# Altium footprint library MainFPs.PcbLib: 206 footprints (part 12 of 13)
Each footprint in its own frame and in the unit in brackets; x right, y up, seen from the top. Pads: shape width x height; smd on the part's side, far side on the other; paste and mask are expansions set on the pad; w line width, h text height; cw(c..) or ccw(c..) is an arc to the next point about the centre after c.
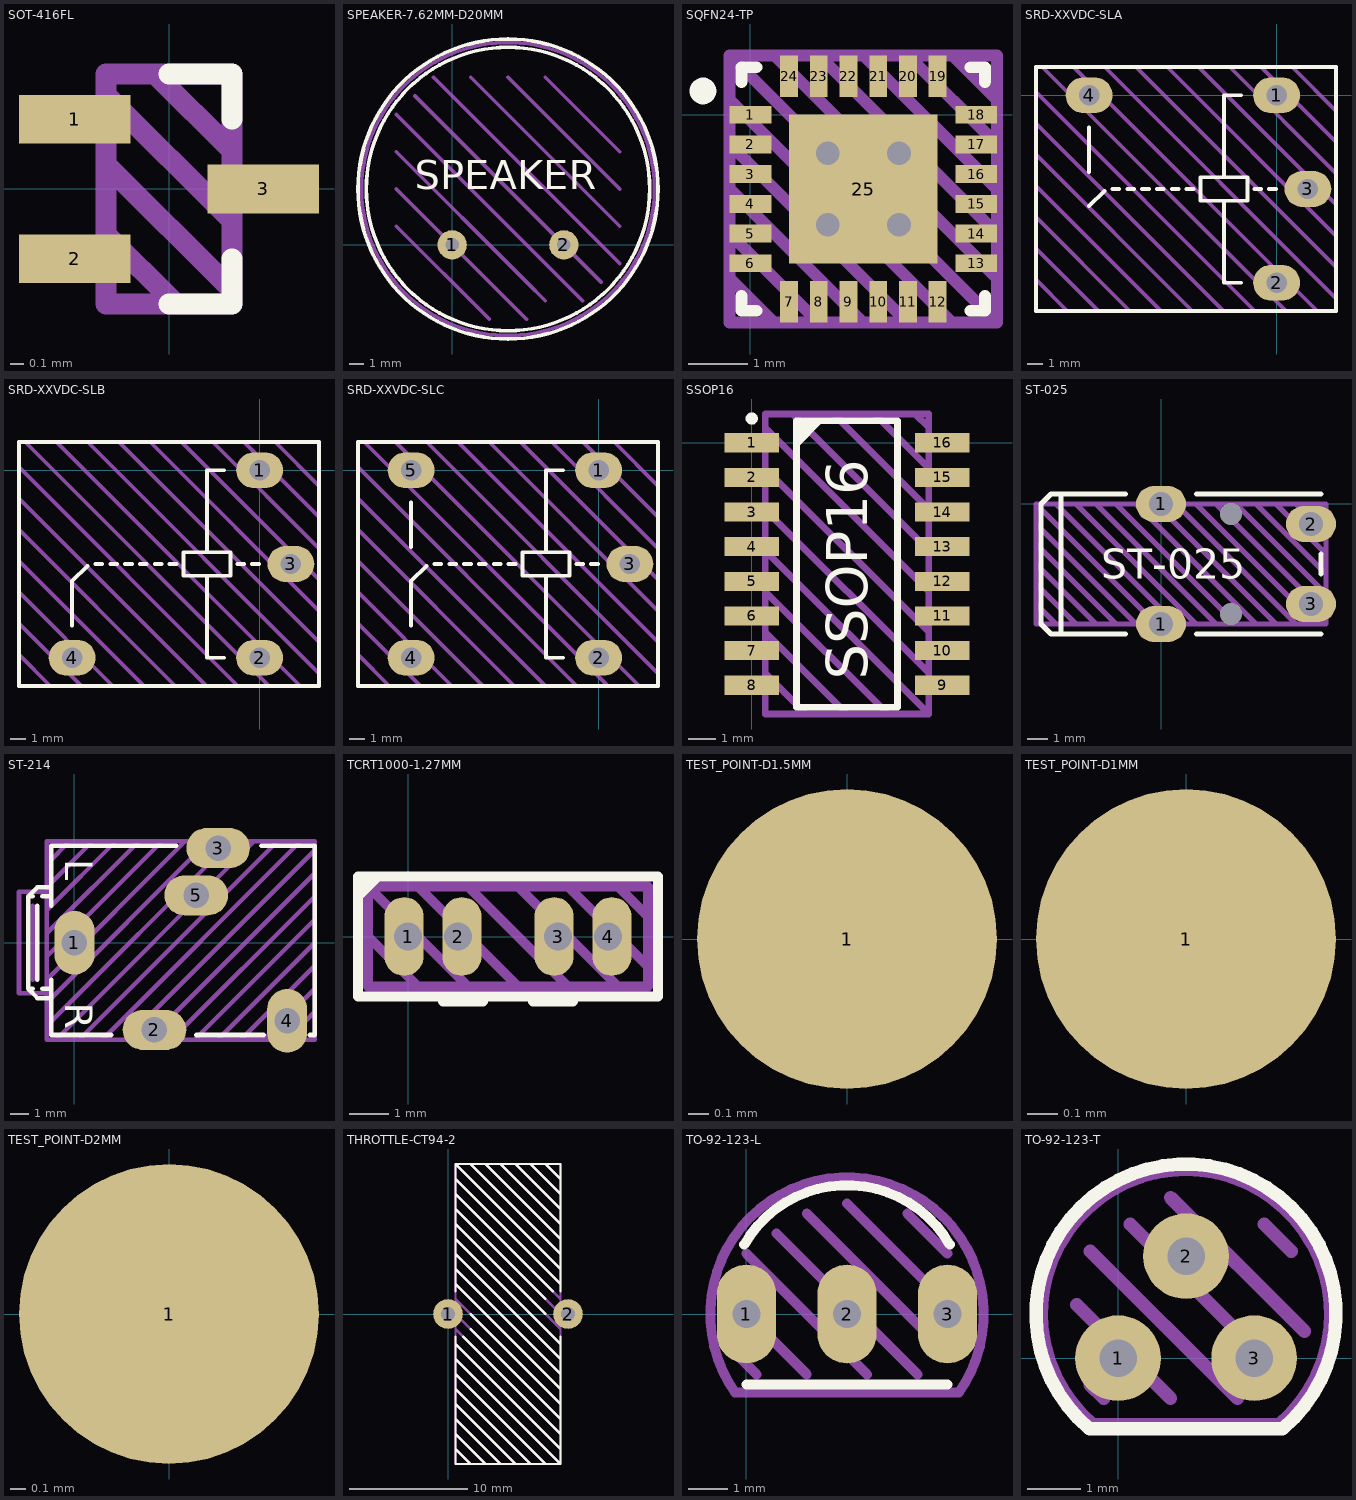
[diagram p11: the footprints below, top view; thin cyan lines are the x and y axes]

## SOT-416FL [mm] "SC-89 (EMT3)"
pads (3):
  rect 0.8x0.35 smd: 1(-0.675,0.5) 2(-0.675,-0.5) 3(0.675,0)
Top Overlay:
  lines w0.15: 0,-0.825 0.45,-0.825 0.45,-0.5 ; 0,0.825 0.45,0.825 0.45,0.5
Draw:
  lines w0.15: -0.45,-0.325 0.05,-0.825 ; -0.45,0.175 0.45,-0.725 ; -0.45,0.675 0.45,-0.225 ; -0.1,0.825 0.45,0.275 ; -0.45,-0.825 -0.45,0.825 0.45,0.825 0.45,-0.825 -0.45,-0.825
3D body "SOTFL50P160X73-3N.step": height 0.73, standoff 0, extent -0.8,-0.823 0.8,0.823

## SPEAKER-7.62MM-D20MM [mm]
pads (2):
  round 2 hole 0.9: 1(0,0) 2(7.62,0)
Top Overlay:
  circle w0.25: c3.81,3.81 r10.239
  circle w0.25: c3.81,3.81 r9.672
  text "SPEAKER" at -2.54,3.81 h2
Draw:
  circle w0.25: c3.81,3.81 r10
  lines w0.25: -3.81,1.27 2.54,-5.08 ; -3.81,3.81 5.08,-5.08 ; -3.81,6.35 5.08,-2.54 6.35,-3.81 ; -3.81,8.89 8.89,-3.81 ; -2.54,10.16 10.16,-2.54 ; -1.27,11.43 11.43,-1.27 ; 1.27,11.43 11.43,1.27 ; 3.81,11.43 11.43,3.81 ; 6.35,11.43 11.43,6.35
Info:
  text "'.Comment'" at -5.08,-8.89 h1.5

## SQFN24-TP [mm]
height 1
pads (25):
  rect 0.7x0.3 smd: 1(0,0) 2(0,-0.5) 3(0,-1) 4(0,-1.5) 5(0,-2) 6(0,-2.5) 13(3.8,-2.5) 14(3.8,-2) 15(3.8,-1.5) 16(3.8,-1) 17(3.8,-0.5) 18(3.8,0)
  rect 0.3x0.7 smd: 7(0.65,-3.15) 8(1.15,-3.15) 9(1.65,-3.15) 10(2.15,-3.15) 11(2.65,-3.15) 12(3.15,-3.15) 19(3.15,0.65) 20(2.65,0.65) 21(2.15,0.65) 22(1.65,0.65) 23(1.15,0.65) 24(0.65,0.65)
  rect 2.5x2.5 all layers, no hole: 25(1.9,-1.25)
via 2.5,-0.65 diameter 0.8 hole 0.4
via 2.5,-1.85 diameter 0.8 hole 0.4
via 1.3,-1.85 diameter 0.8 hole 0.4
via 1.3,-0.65 diameter 0.8 hole 0.4
Top Overlay:
  circle w0.25: c-0.8,0.4 r0.1
  lines w0.2: -0.15,-3.05 -0.15,-3.3 0.1,-3.3 ; -0.15,0.55 -0.15,0.8 0.1,0.8 ; 3.7,-3.3 3.95,-3.3 3.95,-3.05 ; 3.7,0.8 3.95,0.8 3.95,0.55
Draw:
  lines w0.2: -0.35,-2.75 0.4,-3.5 ; -0.35,-2 1.15,-3.5 ; -0.35,-1.25 1.9,-3.5 ; -0.35,-0.5 2.65,-3.5 ; -0.35,0.25 3.4,-3.5 ; 0.4,1 4.15,-2.75 ; 1.15,1 4.15,-2 ; 1.9,1 4.15,-1.25 ; 2.65,1 4.15,-0.5 ; 3.4,1 4.15,0.25 ; -0.35,1 4.15,1 4.15,-3.5 ; -0.35,1 -0.35,-3.5 4.15,-3.5 ; -0.35,1 4.15,-3.5
Info:
  text "'.Comment'" at -1.286,-4.687 h0.75
3D body "PQFN127P600-8N.step": height 1, standoff 0, extent -0.15,-3.3 3.95,0.8

## SRD-XXVDC-SLA [mm]
pads (4):
  oval 3x2.3 hole 1.3: 1(0,0) 2(0,-12) 3(2,-6) 4(-12,0)
Top Overlay:
  lines w0.25: -12,-7.1 -11.025,-6.125 ; -12,-4.9 -12,-2.05 ; -10.512,-6 -10.075,-6 ; -9.562,-6 -9.125,-6 ; -8.612,-6 -8.175,-6 ; -7.663,-6 -7.225,-6 ; -6.713,-6 -6.275,-6 ; -5.763,-6 -5.325,-6 ; -3.375,-6.75 -3.375,-12 -2.275,-12 ; -3.375,-5.25 -3.375,0 -2.275,0 ; -1.425,-6 -0.987,-6 ; -0.475,-6 -0.038,-6 ; -15.4,-13.8 3.8,-13.8 3.8,1.8 -15.4,1.8 -15.4,-13.8 ; -4.875,-6.75 -4.875,-5.25 -1.875,-5.25 -1.875,-6.75 -4.875,-6.75
Draw:
  lines w0.25: -15.4,-11.8 -13.4,-13.8 ; -15.4,-9.8 -11.4,-13.8 ; -15.4,-7.8 -9.4,-13.8 ; -15.4,-5.8 -7.4,-13.8 ; -15.4,-3.8 -5.4,-13.8 ; -15.4,-1.8 -3.4,-13.8 ; -15.4,0.2 -1.4,-13.8 ; -15,1.8 0.6,-13.8 ; -13,1.8 2.6,-13.8 ; -11,1.8 3.8,-13 ; -9,1.8 3.8,-11 ; -7,1.8 3.8,-9 ; -5,1.8 3.8,-7 ; -3,1.8 3.8,-5 ; -1,1.8 3.8,-3 ; 1,1.8 3.8,-1 ; -15.4,-13.8 -15.4,1.8 3.8,1.8 3.8,-13.8 -15.4,-13.8
Info:
  text "'.Comment'" at -15.4,-16.7 h2
3D body: height 15.8, standoff 0, extent -15.4,-13.8 3.8,1.8
3D body: height 1, standoff -3, extent 1.8,-6.55 2.2,-5.45
3D body: height 1, standoff -3, extent -0.3,-0.25 0.3,0.25
3D body: height 1, standoff -3, extent -0.3,-12.25 0.3,-11.75
3D body: height 1, standoff -3, extent -12.5,-0.25 -11.5,0.25

## SRD-XXVDC-SLB [mm]
pads (4):
  oval 3x2.3 hole 1.3: 1(0,0) 2(0,-12) 3(2,-6) 4(-12,-12)
Top Overlay:
  lines w0.25: -12,-9.95 -12,-7.1 -11.025,-6.125 ; -10.512,-6 -10.075,-6 ; -9.562,-6 -9.125,-6 ; -8.612,-6 -8.175,-6 ; -7.663,-6 -7.225,-6 ; -6.713,-6 -6.275,-6 ; -5.763,-6 -5.325,-6 ; -3.375,-6.75 -3.375,-12 -2.275,-12 ; -3.375,-5.25 -3.375,0 -2.275,0 ; -1.425,-6 -0.987,-6 ; -0.475,-6 -0.038,-6 ; -15.4,-13.8 3.8,-13.8 3.8,1.8 -15.4,1.8 -15.4,-13.8 ; -4.875,-6.75 -4.875,-5.25 -1.875,-5.25 -1.875,-6.75 -4.875,-6.75
Draw:
  lines w0.25: -15.4,-11.8 -13.4,-13.8 ; -15.4,-9.8 -11.4,-13.8 ; -15.4,-7.8 -9.4,-13.8 ; -15.4,-5.8 -7.4,-13.8 ; -15.4,-3.8 -5.4,-13.8 ; -15.4,-1.8 -3.4,-13.8 ; -15.4,0.2 -1.4,-13.8 ; -15,1.8 0.6,-13.8 ; -13,1.8 2.6,-13.8 ; -11,1.8 3.8,-13 ; -9,1.8 3.8,-11 ; -7,1.8 3.8,-9 ; -5,1.8 3.8,-7 ; -3,1.8 3.8,-5 ; -1,1.8 3.8,-3 ; 1,1.8 3.8,-1 ; -15.4,-13.8 -15.4,1.8 3.8,1.8 3.8,-13.8 -15.4,-13.8
Info:
  text "'.Comment'" at -15.4,-16.7 h2
3D body: height 15.8, standoff 0, extent -15.4,-13.8 3.8,1.8
3D body: height 1, standoff -3, extent 1.8,-6.55 2.2,-5.45
3D body: height 1, standoff -3, extent -0.3,-0.25 0.3,0.25
3D body: height 1, standoff -3, extent -0.3,-12.25 0.3,-11.75
3D body: height 1, standoff -3, extent -12.5,-12.25 -11.5,-11.75

## SRD-XXVDC-SLC [mm]
pads (5):
  oval 3x2.3 hole 1.3: 1(0,0) 2(0,-12) 3(2,-6) 4(-12,-12) 5(-12,0)
Top Overlay:
  lines w0.25: -12,-9.95 -12,-7.1 -11.025,-6.125 ; -12,-4.9 -12,-2.05 ; -10.512,-6 -10.075,-6 ; -9.562,-6 -9.125,-6 ; -8.612,-6 -8.175,-6 ; -7.663,-6 -7.225,-6 ; -6.713,-6 -6.275,-6 ; -5.763,-6 -5.325,-6 ; -3.375,-6.75 -3.375,-12 -2.275,-12 ; -3.375,-5.25 -3.375,0 -2.275,0 ; -1.425,-6 -0.987,-6 ; -0.475,-6 -0.038,-6 ; -15.4,-13.8 3.8,-13.8 3.8,1.8 -15.4,1.8 -15.4,-13.8 ; -4.875,-6.75 -4.875,-5.25 -1.875,-5.25 -1.875,-6.75 -4.875,-6.75
Draw:
  lines w0.25: -15.4,-11.8 -13.4,-13.8 ; -15.4,-9.8 -11.4,-13.8 ; -15.4,-7.8 -9.4,-13.8 ; -15.4,-5.8 -7.4,-13.8 ; -15.4,-3.8 -5.4,-13.8 ; -15.4,-1.8 -3.4,-13.8 ; -15.4,0.2 -1.4,-13.8 ; -15,1.8 0.6,-13.8 ; -13,1.8 2.6,-13.8 ; -11,1.8 3.8,-13 ; -9,1.8 3.8,-11 ; -7,1.8 3.8,-9 ; -5,1.8 3.8,-7 ; -3,1.8 3.8,-5 ; -1,1.8 3.8,-3 ; 1,1.8 3.8,-1 ; -15.4,-13.8 -15.4,1.8 3.8,1.8 3.8,-13.8 -15.4,-13.8
Info:
  text "'.Comment'" at -15.4,-16.7 h2
3D body: height 15.8, standoff 0, extent -15.4,-13.8 3.8,1.8
3D body: height 1, standoff -3, extent 1.8,-6.55 2.2,-5.45
3D body: height 1, standoff -3, extent -0.3,-0.25 0.3,0.25
3D body: height 1, standoff -3, extent -0.3,-12.25 0.3,-11.75
3D body: height 1, standoff -3, extent -12.5,-0.25 -11.5,0.25
3D body: height 1, standoff -3, extent -12.5,-12.25 -11.5,-11.75

## SSOP16 [mm]
height 2
pads (16):
  rect 2x0.7 smd: 1(0,0) 2(0,-1.27) 3(0,-2.54) 4(0,-3.81) 5(0,-5.08) 6(0,-6.35) 7(0,-7.62) 8(0,-8.89) 9(7,-8.89) 10(7,-7.62) 11(7,-6.35) 12(7,-5.08) 13(7,-3.81) 14(7,-2.54) 15(7,-1.27) 16(7,0)
Top Overlay:
  circle w0.25: c0.008,0.889 r0.1
  region: 1.65,0.805 1.65,-0.199 2.654,0.805
  lines w0.25: 1.65,-9.695 1.65,0.805 5.35,0.805 5.35,-9.695 1.65,-9.695
  text "SSOP16" at 4.25,-8.695 h1.5
Draw:
  lines w0.25: 0.5,-8.445 2,-9.945 2.5,-9.945 ; 0.5,-6.945 3.5,-9.945 4.5,-9.945 ; 0.5,-5.445 5,-9.945 6.5,-9.945 ; 0.5,-3.945 6.5,-9.945 ; 0.5,-2.445 6.5,-8.445 6.5,-9.945 ; 0.5,-0.945 6.5,-6.945 ; 0.5,0.555 6.5,-5.445 ; 1.5,1.055 6.5,-3.945 ; 2,1.055 3,1.055 6.5,-2.445 ; 4.5,1.055 6.5,-0.945 ; 6,1.055 6.5,0.555 ; 6.5,-9.945 0.5,-9.945 0.5,1.055 6.5,1.055 6.5,-9.945 ; 6.5,-6.945 6.5,-6.945
Info:
  text "'.Comment'" at -0.564,-11.303 h1
3D body "SSOP16.step": height 2, standoff 0, extent -0.05,-9.695 7.05,0.805

## ST-025 [mm]
pads (6):
  oval 2.5x1.8 hole 1.2: 1(0,-6) 1(0,0) 2(7.5,-1) 3(7.5,-5)
  round 0 hole 1.1: 4(3.5,-0.5) 5(3.5,-5.5)
Top Overlay:
  lines w0.25: -5,-6.5 -5,0.5 ; -1.778,-6.5 -2,-6.5 -5.5,-6.5 ; -1.778,0.5 -5.5,0.5 -6,0 ; 1.778,-6.5 8,-6.5 ; 1.778,0.508 8,0.5 ; 8,-3.5 8,-2.5 ; -6,0 -6,-6 -5.5,-6.5 ; -6,0 -6,0 ; -5.5,-6.5 -5.5,-6.5
  text "ST-025" at -3,-3.75 h1.5
Draw:
  lines w0.25: -6.25,-5 -5.25,-6 -5,-6 ; -6.25,-4 -4.25,-6 -4,-6 ; -6.25,-3 -3.25,-6 -3,-6 ; -6.25,-2 -2.25,-6 ; -6.25,-1 -1.25,-6 -1,-6 ; -5.25,0 0.75,-6 1,-6 ; -4.25,0 1.75,-6 ; -3.25,0 2.75,-6 ; -2.25,0 3.75,-6 ; -1.25,0 4.75,-6 5,-6 ; -0.25,0 5.75,-6 7,-6 ; 0,-6 -0.25,-6 -6.25,0 ; 0.75,0 6.75,-6 ; 1.75,0 7.75,-6 ; 2.75,0 8.25,-5.5 ; 3.75,0 8.25,-4.5 ; 4.75,0 8.25,-3.5 8.25,-4.5 ; 5.75,0 8.25,-2.5 8.25,-3 ; 6.75,0 8.25,-1.5 8.25,-2 ; 7.75,0 8.25,-0.5 ; 8.25,-5 8.25,-4.5 ; -6.25,0 8.25,0 8.25,-6 -6.25,-6 -6.25,0
Info:
  text "'.Comment'" at -5.588,-8.128 h1
3D body: height 5.1, standoff 0, extent -2,0 0.5,0.25
3D body: height 0.25, standoff -2, extent 7,-1.25 8,-0.75
3D body: height 0.25, standoff -2, extent 7,-5.25 8,-4.75
3D body: height 0.25, standoff -2, extent -0.5,-6.25 0.5,-5.75
3D body: height 0.25, standoff -2, extent -0.5,-0.25 0.5,0.25
3D body: height 5, standoff 0, extent -4,-6 8.25,0
3D body: height 5, standoff 0.2, extent -6.5,-5.4 -3.5,-0.6
3D body: height 5.1, standoff 0, extent -2,-6.25 0.5,-6
3D body: height 5.1, standoff 5, extent -2,-6.25 3.5,0.25

## ST-214 [mm]
pads (5):
  oval 2.2x3.5 hole 1.4: 1(0,0) 4(11.7,-4.3)
  oval 3.5x2.2 hole 1.4: 2(4.4,-4.8) 3(7.9,5.2) 5(6.7,2.6)
Top Overlay:
  lines w0.25: -2.286,-2.54 -2.54,-2.54 ; -2.286,2.54 -2.54,2.54 ; -2.032,-2.032 -2.032,2.032 ; -1.778,-2.54 -1.27,-2.54 ; -1.778,2.54 -1.27,2.54 ; -1.27,-3.048 -2.032,-3.048 -2.54,-2.54 ; -1.27,-2.032 -1.27,-2.286 -1.27,-5.08 0.762,-5.08 2.032,-5.08 ; -1.27,2.032 -1.27,2.54 ; -1.27,3.048 -2.032,3.048 -2.54,2.54 ; 5.588,5.334 4.318,5.334 -1.27,5.334 -1.27,2.54 ; 6.7,-5.08 10.414,-5.08 ; 10.287,5.334 13.208,5.334 13.208,-5.08 12.954,-5.08 ; -2.54,-2.54 -2.54,2.54
  text "L" at -0.508,4.572 h1.52
  text "R" at -0.508,-3.302 h1.52
Draw:
  lines w0.25: -2.286,-2.032 -2.286,2.032 ; -1.524,-4.572 8.636,5.588 7.366,5.588 -1.524,-3.302 -1.524,-2.032 6.096,5.588 4.826,5.588 -1.524,-0.762 -1.524,0.508 3.556,5.588 2.286,5.588 -1.524,1.778 -1.524,3.048 1.016,5.588 -0.254,5.588 -1.524,4.318 ; -1.524,-2.794 -3.048,-2.794 -3.048,2.794 -1.524,2.794 ; -1.016,-5.334 9.906,5.588 11.176,5.588 0.254,-5.334 1.524,-5.334 12.446,5.588 ; 2.794,-5.334 13.208,5.08 ; 4.064,-5.334 13.208,3.81 13.208,2.54 5.334,-5.334 ; 6.604,-5.334 13.208,1.27 13.208,0 7.874,-5.334 9.144,-5.334 13.208,-1.27 13.208,-2.54 10.414,-5.334 ; 11.684,-5.334 13.208,-3.81 ; -1.524,-5.334 -1.524,5.588 13.208,5.588 13.208,-5.334 -1.524,-5.334
Info:
  text "'.Comment'" at -1.27,-7.366 h1.25
3D body: height 6, standoff 5.1, extent -1.524,-1.8 12.476,1.811
3D body: height 6, standoff 0, extent 12.4,-1.8 13.208,1.8
3D body: height 6, standoff 0, extent -1.524,1.8 13.208,5.588
3D body: height 6.15, standoff 5.95, extent -1.524,-5.334 13.208,5.588
3D body: height 0.03, standoff -1.78, extent -0.254,-0.762 0.254,0.762
3D body: height 0.03, standoff -1.78, extent 3.638,-5.054 5.162,-4.546
3D body: height 0.03, standoff -1.78, extent 7.138,4.946 8.662,5.454
3D body: height 4.8, standoff 1.2, extent -1.524,-1.8 12.476,1.8
3D body: height 6, standoff 0, extent -1.524,-5.334 13.208,-1.8
3D body: height 1.3, standoff 0, extent -1.524,-1.8 12.476,1.8
3D body: height 6, standoff 0.2, extent -5,-2.9 -1.5,2.9

## TCRT1000-1.27MM [mm]
pads (4):
  oval 1x2 hole 0.7 copper offset -0.1,0: 1(0,0) 3(3.81,0)
  oval 1x2 hole 0.7 copper offset 0.1,0: 2(1.27,0) 4(5.08,0)
Top Overlay:
  lines w0.25: -1.27,1.016 -0.762,1.524 ; -1.27,1.27 -1.016,1.524 -0.762,1.524 ; 0,1.524 -0.762,1.524 ; 0.889,-1.651 1.905,-1.651 ; 3.175,-1.651 4.191,-1.651 ; -1.27,-1.524 6.35,-1.524 6.35,1.524 2.54,1.524 -1.27,1.524 -1.27,-1.524
Draw:
  lines w0.25: -1.016,0 0.254,-1.27 1.27,-1.27 ; 0.254,1.27 2.794,-1.27 2.54,-1.27 1.524,-1.27 -1.016,1.27 ; 1.524,1.27 4.064,-1.27 5.08,-1.27 6.096,-1.27 ; 2.794,1.27 5.334,-1.27 6.096,-1.27 ; 4.064,1.27 6.096,-0.762 6.096,-1.27 ; 5.334,1.27 6.096,0.508 6.096,0 ; -1.016,1.27 -1.016,-1.27 6.096,-1.27 ; -1.016,1.27 6.096,1.27 6.096,-1.27
Info:
  text "'.Comment'" at -1.143,-2.667 h0.75
3D body: height 11, standoff 9, extent 0,-1.325 5.08,-1.25
3D body: height 6.5, standoff 6, extent 5.33,-0.15 5.78,0.15
3D body: height 8, standoff -1.78, extent 4.83,-0.15 5.33,0.15
3D body: height 6.5, standoff 6, extent 3.11,-0.15 3.56,0.15
3D body: height 8, standoff -1.78, extent 3.56,-0.15 4.06,0.15
3D body: height 6.5, standoff 6, extent 1.52,-0.15 1.97,0.15
3D body: height 8, standoff -1.78, extent 1.02,-0.15 1.52,0.15
3D body: height 6.5, standoff 6, extent -0.7,-0.15 -0.25,0.15
3D body: height 8, standoff -1.78, extent -0.25,-0.15 0.25,0.15
3D body: height 12, standoff 8, extent 2.5,-1.35 6,-1.25
3D body: height 11, standoff -1.78, extent -0.2,-0.1 0.2,0.1
3D body: height 12, standoff 8, extent -1,-1.35 2.5,-1.25
3D body: height 12, standoff 8, extent -1,-1.25 6,1.25

## TEST_POINT-D1.5MM [mm]
pads (1):
  round 1.5 smd: 1(0,0)

## TEST_POINT-D1MM [mm]
pads (1):
  round 1 smd: 1(0,0)

## TEST_POINT-D2MM [mm]
pads (1):
  round 2 smd: 1(0,0)

## THROTTLE-CT94-2 [mm]
pads (2):
  round 2.5 hole 1.2: 1(0,0) 2(10.16,0)
Top Overlay:
  lines w0.2: 0.635,-11.43 1.905,-12.7 ; 0.635,-10.16 3.175,-12.7 ; 0.635,-8.89 4.445,-12.7 ; 0.635,-7.62 5.715,-12.7 ; 0.635,-6.35 6.985,-12.7 ; 0.635,-5.08 8.255,-12.7 ; 0.635,-3.81 9.525,-12.7 ; 0.635,-2.54 9.525,-11.43 ; 0.635,-1.905 0.635,-12.7 9.525,-12.7 ; 0.635,1.905 0.635,12.7 ; 0.635,2.54 9.525,-6.35 ; 0.635,3.81 9.525,-5.08 ; 0.635,5.08 9.525,-3.81 ; 0.635,6.35 9.525,-2.54 ; 0.635,7.62 8.255,0 ; 0.635,8.89 8.255,1.27 ; 0.635,10.16 8.89,1.905 ; 0.635,11.43 9.525,2.54 ; 1.27,-1.905 9.525,-10.16 ; 1.905,-1.27 9.525,-8.89 ; 1.905,0 9.525,-7.62 ; 1.905,12.7 9.525,5.08 ; 3.175,12.7 9.525,6.35 ; 4.445,12.7 9.525,7.62 ; 5.715,12.7 9.525,8.89 ; 6.985,12.7 9.525,10.16 ; 8.255,12.7 9.525,11.43 ; 9.525,-1.905 9.525,-12.7 ; 9.525,1.905 9.525,12.7 0.635,12.7 ; 9.525,3.81 0.635,12.7
Draw:
  lines w0.2: 0.635,-11.43 1.905,-12.7 ; 0.635,-10.16 3.175,-12.7 ; 0.635,-8.89 4.445,-12.7 ; 0.635,-7.62 5.715,-12.7 ; 0.635,-6.35 6.985,-12.7 ; 0.635,-5.08 8.255,-12.7 ; 0.635,-3.81 9.525,-12.7 ; 0.635,-2.54 9.525,-11.43 ; 0.635,-1.27 9.525,-10.16 ; 0.635,0 9.525,-8.89 ; 0.635,1.27 9.525,-7.62 ; 0.635,2.54 9.525,-6.35 ; 0.635,3.81 9.525,-5.08 ; 0.635,5.08 9.525,-3.81 ; 0.635,6.35 9.525,-2.54 ; 0.635,7.62 9.525,-1.27 ; 0.635,8.89 9.525,0 ; 0.635,10.16 9.525,1.27 ; 0.635,11.43 9.525,2.54 ; 1.905,12.7 9.525,5.08 ; 3.175,12.7 9.525,6.35 ; 4.445,12.7 9.525,7.62 ; 5.715,12.7 9.525,8.89 ; 6.985,12.7 9.525,10.16 ; 8.255,12.7 9.525,11.43 ; 9.525,3.81 0.635,12.7 ; 0.635,12.7 0.635,-12.7 9.525,-12.7 ; 0.635,12.7 9.525,12.7 9.525,-12.7
Info:
  text "'.Comment'" at 0,-14.605 h1.5

## TO-92-123-L [mm]
pads (3):
  oval 1.5x2.5 hole 0.7: 1(0,0) 2(2.54,0) 3(5.08,0)
Top Overlay:
  lines w0.25: -0.058,1.754 cw(c2.54,0.254) 5.138,1.754 ; 0,-1.778 5.08,-1.778
Draw:
  lines w0.25: -0.254,-1.016 0.254,-1.524 ; -0.254,0.254 1.524,-1.524 ; 0,1.524 3.048,-1.524 ; 0.762,2.032 4.318,-1.524 ; 1.524,2.54 5.08,-1.016 ; 2.54,2.794 5.334,0 ; 4.064,2.54 5.08,1.524 ; -0.29,-1.982 cw(c2.54,0) 5.37,-1.982 -0.29,-1.982
Info:
  text "'.Comment'" at -0.635,-3.175 h0.75
3D body: height 2.18, standoff -0.16, extent 3.555,-0.3 5.365,0.3
3D body: height 3, standoff 2, extent 0.97,-0.3 1.57,0.3
3D body: height 3, standoff 2, extent 3.509,-0.3 4.109,0.3
3D body: height 0.3, standoff -0.3, extent -0.301,-0.3 0.299,0.3
3D body: height 0.3, standoff -0.3, extent 4.779,-0.3 5.379,0.3
3D body: height 5.22, standoff -1.78, extent 2.239,-0.3 2.839,0.3
3D body: height 0, standoff -1.78, extent -0.301,-0.3 0.299,0.3
3D body: height 0, standoff -1.78, extent 4.779,-0.3 5.379,0.3
3D body: height 2.3, standoff 1.7, extent 0.97,-0.3 1.57,0.3
3D body: height 2.3, standoff 1.7, extent 3.509,-0.3 4.109,0.3
3D body: height 2.18, standoff -0.16, extent -0.285,-0.3 1.525,0.3
3D body: height 7, standoff 3, extent 2.537,-1.422 5.058,2.997
3D body: height 7, standoff 3, extent 0.019,-1.422 2.54,2.997

## TO-92-123-T [mm]
pads (3):
  round 1.6 hole 0.7: 1(0,0) 2(1.27,1.905) 3(2.54,0)
Top Overlay:
  lines w0.25: -0.531,-1.319 cw(c1.269,0.826) 3.068,-1.319 -0.531,-1.319
Draw:
  lines w0.25: -0.77,1 0.98,-0.75 ; -0.52,-0.5 -0.27,-0.75 ; -0.52,2 2.23,-0.75 ; 0.23,2.5 2.98,-0.25 ; 0.98,3 3.48,0.5 ; 2.73,2.5 3.23,2 ; -0.27,-0.75 -0.27,-0.75 ; 3.23,2 3.23,2 ; -0.467,-1.243 cw(c1.269,0.826) 3.004,-1.243 -0.467,-1.243
Info:
  text "'.Comment'" at -1.905,-2.54 h0.75
3D body: height 2.16, standoff -0.13, extent -0.3,-0.27 0.3,1.246
3D body: height 2.3, standoff 1.7, extent 2.239,0.666 2.839,1.266
3D body: height 2.3, standoff 1.7, extent -0.299,0.665 0.301,1.265
3D body: height 3, standoff 2, extent 0.97,0.665 1.57,1.265
3D body: height 3, standoff 2, extent 2.239,0.666 2.839,1.266
3D body: height 3, standoff 2, extent -0.299,0.665 0.301,1.265
3D body: height 0, standoff -1.78, extent 0.969,1.605 1.569,2.205
3D body: height 0.3, standoff -0.3, extent 0.969,1.605 1.569,2.205
3D body: height 2.3, standoff 1.7, extent 0.97,0.665 1.57,1.265
3D body: height 0.3, standoff -0.3, extent 2.24,-0.3 2.84,0.3
3D body: height 0, standoff -1.78, extent 2.24,-0.3 2.84,0.3
3D body: height 0.3, standoff -0.3, extent -0.3,-0.3 0.3,0.3
3D body: height 0, standoff -1.78, extent -0.3,-0.3 0.3,0.3
3D body: height 2.16, standoff -0.13, extent 2.24,-0.27 2.84,1.246
3D body: height 2.17, standoff -0.13, extent 0.969,0.682 1.569,2.177
3D body: height 7, standoff 3, extent -1.25,-0.787 1.271,3.632
3D body: height 7, standoff 3, extent 1.268,-0.787 3.79,3.632